# Altium footprint library LUMI_Handy_Soldering_LIB.PcbLib: 562 footprints (part 36 of 36)
Each footprint in its own frame and in the unit in brackets; x right, y up, seen from the top. Pads: shape width x height; smd on the part's side, far side on the other; paste and mask are expansions set on the pad; w line width, h text height; cw(c..) or ccw(c..) is an arc to the next point about the centre after c.
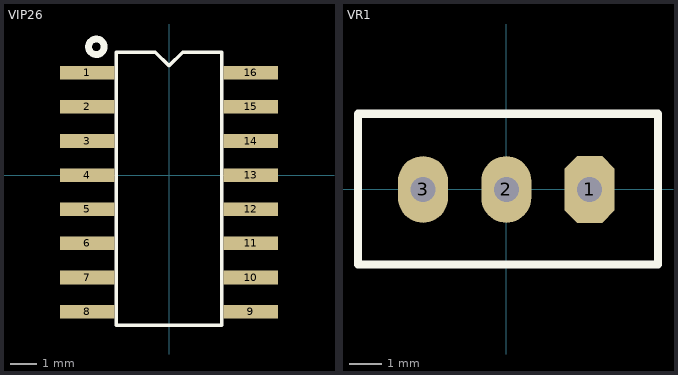
[diagram p35: the footprints below, top view; thin cyan lines are the x and y axes]

## VIP26 [mil]
pads (16):
  rect 80x20 smd: 1(-120,150) 2(-120,100) 3(-120,50) 4(-120,0) 5(-120,-50) 6(-120,-100) 7(-120,-150) 8(-120,-200) 9(120,-200) 10(120,-150) 11(120,-100) 12(120,-50) 13(120,0) 14(120,50) 15(120,100) 16(120,150)
Top Overlay:
  circle w10: c-106.4,188 r11.4
  lines w5: -77,-220 -77,180 -20,180 0,160 20,180 77,180 77,-220 -77,-220
3D body: height 68.45, standoff -0.98, extent -120.8,-222.52 120.8,170

## VR1 [mil]
pads (3):
  oct 60x80 hole 30: 1(100,0)
  oval 60x80 hole 30: 2(0,0) 3(-100,0)
Top Overlay:
  lines w10: 182,89 180,91 -178,91 -178,-90 182,-90 182,91
3D body: height 454.25, standoff -234.73, extent -181,-93.49 181.2,95.49